# Altium footprint library Package_DFN_QFN.PcbLib: 557 footprints (part 17 of 35)
Each footprint in its own frame and in the unit in brackets; x right, y up, seen from the top. Pads: shape width x height; smd on the part's side, far side on the other; paste and mask are expansions set on the pad; w line width, h text height; cw(c..) or ccw(c..) is an arc to the next point about the centre after c.
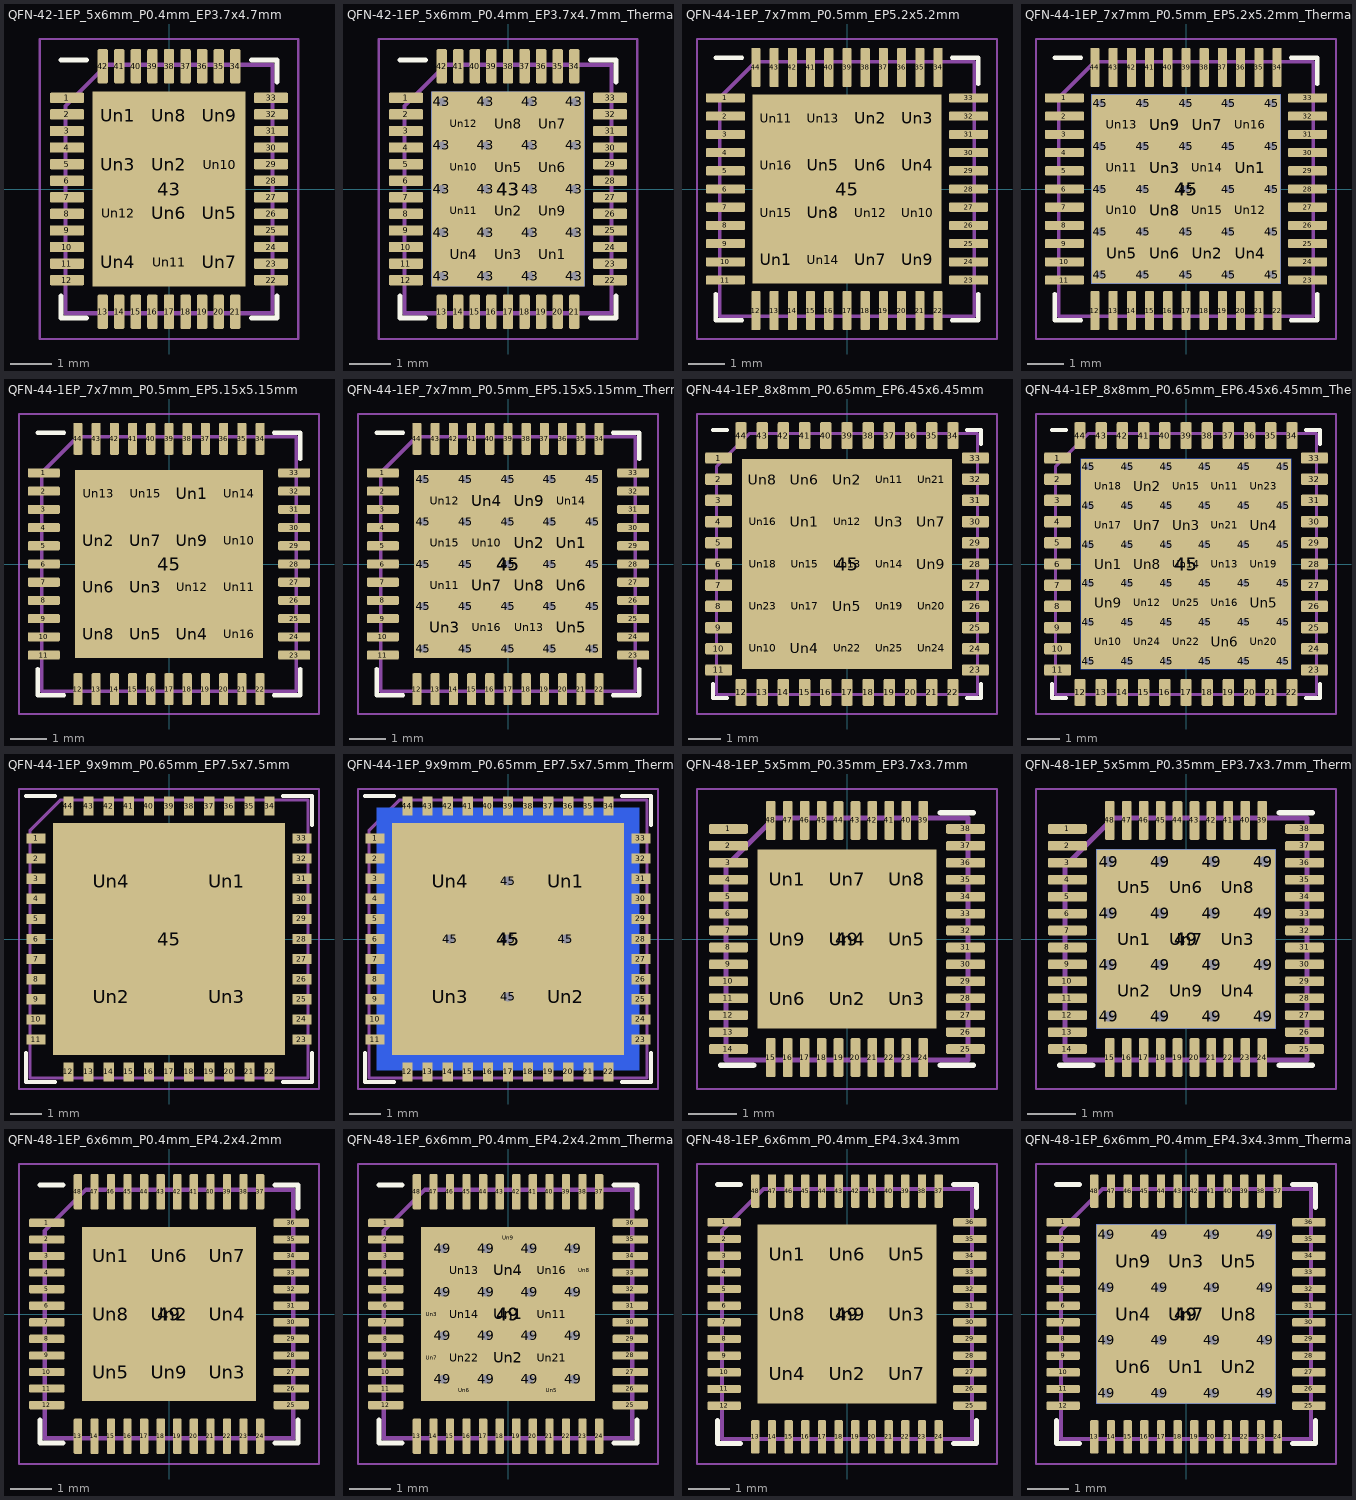
[diagram p16: the footprints below, top view; thin cyan lines are the x and y axes]

## QFN-42-1EP_5x6mm_P0.4mm_EP3.7x4.7mm [mm]
pads (55):
  rrect25% 0.825x0.25 smd: 1(-2.462,2.2) 2(-2.462,1.8) 3(-2.462,1.4) 4(-2.462,1) 5(-2.462,0.6) 6(-2.462,0.2) 7(-2.462,-0.2) 8(-2.462,-0.6) 9(-2.462,-1) 10(-2.462,-1.4) 11(-2.462,-1.8) 12(-2.462,-2.2) 22(2.462,-2.2) 23(2.462,-1.8) 24(2.462,-1.4) 25(2.462,-1) 26(2.462,-0.6) 27(2.462,-0.2) 28(2.462,0.2) 29(2.462,0.6) 30(2.462,1) 31(2.462,1.4) 32(2.462,1.8) 33(2.462,2.2)
  rrect25% 0.25x0.825 smd: 13(-1.6,-2.963) 14(-1.2,-2.963) 15(-0.8,-2.963) 16(-0.4,-2.963) 17(0,-2.963) 18(0.4,-2.963) 19(0.8,-2.963) 20(1.2,-2.963) 21(1.6,-2.963) 34(1.6,2.963) 35(1.2,2.963) 36(0.8,2.963) 37(0.4,2.963) 38(0,2.963) 39(-0.4,2.963) 40(-0.8,2.963) 41(-1.2,2.963) 42(-1.6,2.963)
  rect 3.7x4.7 smd: 43(0,0)
  rrect25% 0.99x0.95 on Top Paste: Un1(-1.23,1.77) Un2(0,0.59) Un3(-1.23,0.59) Un4(-1.23,-1.77) Un5(1.23,-0.59) Un6(0,-0.59) Un7(1.23,-1.77) Un8(0,1.77) Un9(1.23,1.77) Un10(1.23,0.59) Un11(0,-1.77) Un12(-1.23,-0.59)
F.SilkS:
  lines w0.12: -2.61,-2.585 -2.61,-3.11 -1.985,-3.11 ; -2.61,3.11 -1.985,3.11 ; 1.985,-3.11 2.61,-3.11 2.61,-2.585 ; 1.985,3.11 2.61,3.11 2.61,2.585
F.CrtYd:
  lines w0.05: -3.12,-3.62 3.12,-3.62 3.12,3.62 -3.12,3.62 -3.12,-3.62
F.Fab:
  lines w0.1: -2.5,-3 -2.5,2 -1.5,3 2.5,3 2.5,-3 -2.5,-3
  text "'.Designator'" at -4.047,-0.84 h1

## QFN-42-1EP_5x6mm_P0.4mm_EP3.7x4.7mm_ThermalVias [mm]
pads (76):
  rrect25% 0.825x0.25 smd: 1(-2.462,2.2) 2(-2.462,1.8) 3(-2.462,1.4) 4(-2.462,1) 5(-2.462,0.6) 6(-2.462,0.2) 7(-2.462,-0.2) 8(-2.462,-0.6) 9(-2.462,-1) 10(-2.462,-1.4) 11(-2.462,-1.8) 12(-2.462,-2.2) 22(2.462,-2.2) 23(2.462,-1.8) 24(2.462,-1.4) 25(2.462,-1) 26(2.462,-0.6) 27(2.462,-0.2) 28(2.462,0.2) 29(2.462,0.6) 30(2.462,1) 31(2.462,1.4) 32(2.462,1.8) 33(2.462,2.2)
  rrect25% 0.25x0.825 smd: 13(-1.6,-2.963) 14(-1.2,-2.963) 15(-0.8,-2.963) 16(-0.4,-2.963) 17(0,-2.963) 18(0.4,-2.963) 19(0.8,-2.963) 20(1.2,-2.963) 21(1.6,-2.963) 34(1.6,2.963) 35(1.2,2.963) 36(0.8,2.963) 37(0.4,2.963) 38(0,2.963) 39(-0.4,2.963) 40(-0.8,2.963) 41(-1.2,2.963) 42(-1.6,2.963)
  round 0.5 hole 0.2: 43(-1.6,-2.1) 43(-1.6,-1.05) 43(-1.6,0) 43(-1.6,1.05) 43(-1.6,2.1) 43(-0.533,-2.1) 43(-0.533,-1.05) 43(-0.533,0) 43(-0.533,1.05) 43(-0.533,2.1) 43(0.533,-2.1) 43(0.533,-1.05) 43(0.533,0) 43(0.533,1.05) 43(0.533,2.1) 43(1.6,-2.1) 43(1.6,-1.05) 43(1.6,0) 43(1.6,1.05) 43(1.6,2.1)
  rect 3.7x4.7 smd: 43(0,0)
  rect 3.7x4.7 smd far side: 43(0,0)
  round 0.799 on Top Paste: Un1(1.067,-1.575) Un2(0,-0.525) Un3(0,-1.575) Un4(-1.067,-1.575) Un5(0,0.525) Un6(1.067,0.525) Un7(1.067,1.575) Un8(0,1.575) Un9(1.067,-0.525) Un10(-1.067,0.525) Un11(-1.067,-0.525) Un12(-1.067,1.575)
F.SilkS:
  lines w0.12: -2.61,-2.585 -2.61,-3.11 -1.985,-3.11 ; -2.61,3.11 -1.985,3.11 ; 1.985,-3.11 2.61,-3.11 2.61,-2.585 ; 1.985,3.11 2.61,3.11 2.61,2.585
F.Paste:
  region: 1.433,-1.323 1.433,-1.827 1.341,-1.919 0.792,-1.919 0.7,-1.827 0.7,-1.323 0.792,-1.231 1.341,-1.231
  region: 0.366,-0.273 0.366,-0.777 0.274,-0.869 -0.274,-0.869 -0.366,-0.777 -0.366,-0.273 -0.274,-0.181 0.274,-0.181
  region: 0.366,-1.323 0.366,-1.827 0.274,-1.919 -0.274,-1.919 -0.366,-1.827 -0.366,-1.323 -0.274,-1.231 0.274,-1.231
  region: -0.7,-1.323 -0.7,-1.827 -0.792,-1.919 -1.341,-1.919 -1.433,-1.827 -1.433,-1.323 -1.341,-1.231 -0.792,-1.231
  region: 0.366,0.777 0.366,0.273 0.274,0.181 -0.274,0.181 -0.366,0.273 -0.366,0.777 -0.274,0.869 0.274,0.869
  region: 1.433,0.777 1.433,0.273 1.341,0.181 0.792,0.181 0.7,0.273 0.7,0.777 0.792,0.869 1.341,0.869
  region: 1.433,1.827 1.433,1.323 1.341,1.231 0.792,1.231 0.7,1.323 0.7,1.827 0.792,1.919 1.341,1.919
  region: 0.366,1.827 0.366,1.323 0.274,1.231 -0.274,1.231 -0.366,1.323 -0.366,1.827 -0.274,1.919 0.274,1.919
  region: 1.433,-0.273 1.433,-0.777 1.341,-0.869 0.792,-0.869 0.7,-0.777 0.7,-0.273 0.792,-0.181 1.341,-0.181
  region: -0.7,0.777 -0.7,0.273 -0.792,0.181 -1.341,0.181 -1.433,0.273 -1.433,0.777 -1.341,0.869 -0.792,0.869
  region: -0.7,-0.273 -0.7,-0.777 -0.792,-0.869 -1.341,-0.869 -1.433,-0.777 -1.433,-0.273 -1.341,-0.181 -0.792,-0.181
  region: -0.7,1.827 -0.7,1.323 -0.792,1.231 -1.341,1.231 -1.433,1.323 -1.433,1.827 -1.341,1.919 -0.792,1.919
F.CrtYd:
  lines w0.05: -3.12,-3.62 3.12,-3.62 3.12,3.62 -3.12,3.62 -3.12,-3.62
F.Fab:
  lines w0.1: -2.5,-3 -2.5,2 -1.5,3 2.5,3 2.5,-3 -2.5,-3
  text "'.Designator'" at -4.047,-0.84 h1

## QFN-44-1EP_7x7mm_P0.5mm_EP5.2x5.2mm [mm]
pads (61):
  rrect25% 1.075x0.25 smd: 1(-3.337,2.5) 2(-3.337,2) 3(-3.337,1.5) 4(-3.337,1) 5(-3.337,0.5) 6(-3.337,0) 7(-3.337,-0.5) 8(-3.337,-1) 9(-3.337,-1.5) 10(-3.337,-2) 11(-3.337,-2.5) 23(3.337,-2.5) 24(3.337,-2) 25(3.337,-1.5) 26(3.337,-1) 27(3.337,-0.5) 28(3.337,0) 29(3.337,0.5) 30(3.337,1) 31(3.337,1.5) 32(3.337,2) 33(3.337,2.5)
  rrect25% 0.25x1.075 smd: 12(-2.5,-3.337) 13(-2,-3.337) 14(-1.5,-3.337) 15(-1,-3.337) 16(-0.5,-3.337) 17(0,-3.337) 18(0.5,-3.337) 19(1,-3.337) 20(1.5,-3.337) 21(2,-3.337) 22(2.5,-3.337) 34(2.5,3.337) 35(2,3.337) 36(1.5,3.337) 37(1,3.337) 38(0.5,3.337) 39(0,3.337) 40(-0.5,3.337) 41(-1,3.337) 42(-1.5,3.337) 43(-2,3.337) 44(-2.5,3.337)
  rect 5.2x5.2 smd: 45(0,0)
  rrect24% 1.05x1.05 on Top Paste: Un1(-1.95,-1.95) Un2(0.65,1.95) Un3(1.95,1.95) Un4(1.95,0.65) Un5(-0.65,0.65) Un6(0.65,0.65) Un7(0.65,-1.95) Un8(-0.65,-0.65) Un9(1.95,-1.95) Un10(1.95,-0.65) Un11(-1.95,1.95) Un12(0.65,-0.65) Un13(-0.65,1.95) Un14(-0.65,-1.95) Un15(-1.95,-0.65) Un16(-1.95,0.65)
F.SilkS:
  lines w0.12: -3.61,-2.885 -3.61,-3.61 -2.885,-3.61 ; -3.61,3.61 -2.885,3.61 ; 2.885,-3.61 3.61,-3.61 3.61,-2.885 ; 2.885,3.61 3.61,3.61 3.61,2.885
F.CrtYd:
  lines w0.05: -4.12,-4.12 4.12,-4.12 4.12,4.12 -4.12,4.12 -4.12,-4.12
F.Fab:
  lines w0.1: -3.5,-3.5 -3.5,2.5 -2.5,3.5 3.5,3.5 3.5,-3.5 -3.5,-3.5
  text "'.Designator'" at -4.047,-0.84 h1

## QFN-44-1EP_7x7mm_P0.5mm_EP5.2x5.2mm_ThermalVias [mm]
pads (87):
  rrect25% 1.075x0.25 smd: 1(-3.337,2.5) 2(-3.337,2) 3(-3.337,1.5) 4(-3.337,1) 5(-3.337,0.5) 6(-3.337,0) 7(-3.337,-0.5) 8(-3.337,-1) 9(-3.337,-1.5) 10(-3.337,-2) 11(-3.337,-2.5) 23(3.337,-2.5) 24(3.337,-2) 25(3.337,-1.5) 26(3.337,-1) 27(3.337,-0.5) 28(3.337,0) 29(3.337,0.5) 30(3.337,1) 31(3.337,1.5) 32(3.337,2) 33(3.337,2.5)
  rrect25% 0.25x1.075 smd: 12(-2.5,-3.337) 13(-2,-3.337) 14(-1.5,-3.337) 15(-1,-3.337) 16(-0.5,-3.337) 17(0,-3.337) 18(0.5,-3.337) 19(1,-3.337) 20(1.5,-3.337) 21(2,-3.337) 22(2.5,-3.337) 34(2.5,3.337) 35(2,3.337) 36(1.5,3.337) 37(1,3.337) 38(0.5,3.337) 39(0,3.337) 40(-0.5,3.337) 41(-1,3.337) 42(-1.5,3.337) 43(-2,3.337) 44(-2.5,3.337)
  round 0.5 hole 0.2: 45(-2.35,-2.35) 45(-2.35,-1.175) 45(-2.35,0) 45(-2.35,1.175) 45(-2.35,2.35) 45(-1.175,-2.35) 45(-1.175,-1.175) 45(-1.175,0) 45(-1.175,1.175) 45(-1.175,2.35) 45(0,-2.35) 45(0,-1.175) 45(0,0) 45(0,1.175) 45(0,2.35) 45(1.175,-2.35) 45(1.175,-1.175) 45(1.175,0) 45(1.175,1.175) 45(1.175,2.35) 45(2.35,-2.35) 45(2.35,-1.175) 45(2.35,0) 45(2.35,1.175) 45(2.35,2.35)
  rect 5.2x5.2 smd: 45(0,0)
  rect 5.2x5.2 smd far side: 45(0,0)
  rrect25% 1.007x1.007 on Top Paste: Un1(1.763,0.587) Un2(0.587,-1.763) Un3(-0.587,0.587) Un4(1.763,-1.763) Un5(-1.763,-1.763) Un6(-0.587,-1.763) Un7(0.587,1.763) Un8(-0.587,-0.587) Un9(-0.587,1.763) Un10(-1.763,-0.587) Un11(-1.763,0.587) Un12(1.763,-0.587) Un13(-1.763,1.763) Un14(0.587,0.587) Un15(0.587,-0.587) Un16(1.763,1.763)
F.SilkS:
  lines w0.12: -3.61,-2.885 -3.61,-3.61 -2.885,-3.61 ; -3.61,3.61 -2.885,3.61 ; 2.885,-3.61 3.61,-3.61 3.61,-2.885 ; 2.885,3.61 3.61,3.61 3.61,2.885
F.CrtYd:
  lines w0.05: -4.12,-4.12 -4.12,4.12 4.12,4.12 4.12,-4.12 -4.12,-4.12
F.Fab:
  lines w0.1: -3.5,-3.5 -3.5,2.5 -2.5,3.5 3.5,3.5 3.5,-3.5 -3.5,-3.5
  text "'.Designator'" at -4.047,-0.84 h1

## QFN-44-1EP_7x7mm_P0.5mm_EP5.15x5.15mm [mm]
pads (61):
  rrect25% 0.875x0.25 smd: 1(-3.437,2.5) 2(-3.437,2) 3(-3.437,1.5) 4(-3.437,1) 5(-3.437,0.5) 6(-3.437,0) 7(-3.437,-0.5) 8(-3.437,-1) 9(-3.437,-1.5) 10(-3.437,-2) 11(-3.437,-2.5) 23(3.437,-2.5) 24(3.437,-2) 25(3.437,-1.5) 26(3.437,-1) 27(3.437,-0.5) 28(3.437,0) 29(3.437,0.5) 30(3.437,1) 31(3.437,1.5) 32(3.437,2) 33(3.437,2.5)
  rrect25% 0.25x0.875 smd: 12(-2.5,-3.437) 13(-2,-3.437) 14(-1.5,-3.437) 15(-1,-3.437) 16(-0.5,-3.437) 17(0,-3.437) 18(0.5,-3.437) 19(1,-3.437) 20(1.5,-3.437) 21(2,-3.437) 22(2.5,-3.437) 34(2.5,3.437) 35(2,3.437) 36(1.5,3.437) 37(1,3.437) 38(0.5,3.437) 39(0,3.437) 40(-0.5,3.437) 41(-1,3.437) 42(-1.5,3.437) 43(-2,3.437) 44(-2.5,3.437)
  rect 5.15x5.15 smd: 45(0,0)
  rrect24% 1.04x1.04 on Top Paste: Un1(0.645,1.935) Un2(-1.935,0.645) Un3(-0.645,-0.645) Un4(0.645,-1.935) Un5(-0.645,-1.935) Un6(-1.935,-0.645) Un7(-0.645,0.645) Un8(-1.935,-1.935) Un9(0.645,0.645) Un10(1.935,0.645) Un11(1.935,-0.645) Un12(0.645,-0.645) Un13(-1.935,1.935) Un14(1.935,1.935) Un15(-0.645,1.935) Un16(1.935,-1.935)
F.SilkS:
  lines w0.12: -3.61,-2.885 -3.61,-3.61 -2.885,-3.61 ; -3.61,3.61 -2.885,3.61 ; 2.885,-3.61 3.61,-3.61 3.61,-2.885 ; 2.885,3.61 3.61,3.61 3.61,2.885
F.CrtYd:
  lines w0.05: -4.12,-4.12 -4.12,4.12 4.12,4.12 4.12,-4.12 -4.12,-4.12
F.Fab:
  lines w0.1: -3.5,-3.5 3.5,-3.5 3.5,3.5 -2.5,3.5 -3.5,2.5 -3.5,-3.5
  text "'.Designator'" at -4.047,-0.84 h1

## QFN-44-1EP_7x7mm_P0.5mm_EP5.15x5.15mm_ThermalVias [mm]
pads (87):
  rrect25% 0.875x0.25 smd: 1(-3.437,2.5) 2(-3.437,2) 3(-3.437,1.5) 4(-3.437,1) 5(-3.437,0.5) 6(-3.437,0) 7(-3.437,-0.5) 8(-3.437,-1) 9(-3.437,-1.5) 10(-3.437,-2) 11(-3.437,-2.5) 23(3.437,-2.5) 24(3.437,-2) 25(3.437,-1.5) 26(3.437,-1) 27(3.437,-0.5) 28(3.437,0) 29(3.437,0.5) 30(3.437,1) 31(3.437,1.5) 32(3.437,2) 33(3.437,2.5)
  rrect25% 0.25x0.875 smd: 12(-2.5,-3.437) 13(-2,-3.437) 14(-1.5,-3.437) 15(-1,-3.437) 16(-0.5,-3.437) 17(0,-3.437) 18(0.5,-3.437) 19(1,-3.437) 20(1.5,-3.437) 21(2,-3.437) 22(2.5,-3.437) 34(2.5,3.437) 35(2,3.437) 36(1.5,3.437) 37(1,3.437) 38(0.5,3.437) 39(0,3.437) 40(-0.5,3.437) 41(-1,3.437) 42(-1.5,3.437) 43(-2,3.437) 44(-2.5,3.437)
  round 0.5 hole 0.2: 45(-2.325,-2.325) 45(-2.325,-1.162) 45(-2.325,0) 45(-2.325,1.162) 45(-2.325,2.325) 45(-1.162,-2.325) 45(-1.162,-1.162) 45(-1.162,0) 45(-1.162,1.162) 45(-1.162,2.325) 45(0,-2.325) 45(0,-1.162) 45(0,0) 45(0,1.162) 45(0,2.325) 45(1.162,-2.325) 45(1.162,-1.162) 45(1.162,0) 45(1.162,1.162) 45(1.162,2.325) 45(2.325,-2.325) 45(2.325,-1.162) 45(2.325,0) 45(2.325,1.162) 45(2.325,2.325)
  rect 5.15x5.15 smd: 45(0,0)
  rect 5.15x5.15 smd far side: 45(0,0)
  rrect25% 0.997x0.997 on Top Paste: Un1(1.744,0.581) Un2(0.581,0.581) Un3(-1.744,-1.744) Un4(-0.581,1.744) Un5(1.744,-1.744) Un6(1.744,-0.581) Un7(-0.581,-0.581) Un8(0.581,-0.581) Un9(0.581,1.744) Un10(-0.581,0.581) Un11(-1.744,-0.581) Un12(-1.744,1.744) Un13(0.581,-1.744) Un14(1.744,1.744) Un15(-1.744,0.581) Un16(-0.581,-1.744)
F.SilkS:
  lines w0.12: -3.61,-2.885 -3.61,-3.61 -2.885,-3.61 ; -3.61,3.61 -2.885,3.61 ; 2.885,-3.61 3.61,-3.61 3.61,-2.885 ; 2.885,3.61 3.61,3.61 3.61,2.885
F.CrtYd:
  lines w0.05: -4.12,-4.12 -4.12,4.12 4.12,4.12 4.12,-4.12 -4.12,-4.12
F.Fab:
  lines w0.1: -3.5,-3.5 -3.5,2.5 -2.5,3.5 3.5,3.5 3.5,-3.5 -3.5,-3.5
  text "'.Designator'" at -4.047,-0.84 h1

## QFN-44-1EP_8x8mm_P0.65mm_EP6.45x6.45mm [mm]
pads (70):
  rrect25% 0.825x0.35 smd: 1(-3.938,3.25) 2(-3.938,2.6) 3(-3.938,1.95) 4(-3.938,1.3) 5(-3.938,0.65) 6(-3.938,0) 7(-3.938,-0.65) 8(-3.938,-1.3) 9(-3.938,-1.95) 10(-3.938,-2.6) 11(-3.938,-3.25) 23(3.938,-3.25) 24(3.938,-2.6) 25(3.938,-1.95) 26(3.938,-1.3) 27(3.938,-0.65) 28(3.938,0) 29(3.938,0.65) 30(3.938,1.3) 31(3.938,1.95) 32(3.938,2.6) 33(3.938,3.25)
  rrect25% 0.35x0.825 smd: 12(-3.25,-3.938) 13(-2.6,-3.938) 14(-1.95,-3.938) 15(-1.3,-3.938) 16(-0.65,-3.938) 17(0,-3.938) 18(0.65,-3.938) 19(1.3,-3.938) 20(1.95,-3.938) 21(2.6,-3.938) 22(3.25,-3.938) 34(3.25,3.938) 35(2.6,3.938) 36(1.95,3.938) 37(1.3,3.938) 38(0.65,3.938) 39(0,3.938) 40(-0.65,3.938) 41(-1.3,3.938) 42(-1.95,3.938) 43(-2.6,3.938) 44(-3.25,3.938)
  rect 6.45x6.45 smd: 45(0,0)
  rrect24% 1.04x1.04 on Top Paste: Un1(-1.29,1.29) Un2(0,2.58) Un3(1.29,1.29) Un4(-1.29,-2.58) Un5(0,-1.29) Un6(-1.29,2.58) Un7(2.58,1.29) Un8(-2.58,2.58) Un9(2.58,0) Un10(-2.58,-2.58) Un11(1.29,2.58) Un12(0,1.29) Un13(0,0) Un14(1.29,0) Un15(-1.29,0) Un16(-2.58,1.29) Un17(-1.29,-1.29) Un18(-2.58,0) Un19(1.29,-1.29) Un20(2.58,-1.29) Un21(2.58,2.58) Un22(0,-2.58) Un23(-2.58,-1.29) Un24(2.58,-2.58) Un25(1.29,-2.58)
F.SilkS:
  lines w0.12: -4.11,-3.685 -4.11,-4.11 -3.685,-4.11 ; -4.11,4.11 -3.685,4.11 ; 3.685,-4.11 4.11,-4.11 4.11,-3.685 ; 3.685,4.11 4.11,4.11 4.11,3.685
F.CrtYd:
  lines w0.05: -4.6,-4.6 4.6,-4.6 4.6,4.6 -4.6,4.6 -4.6,-4.6
F.Fab:
  lines w0.1: -4,-4 4,-4 4,4 -3,4 -4,3 -4,-4
  text "'.Designator'" at -4.047,-0.84 h1

## QFN-44-1EP_8x8mm_P0.65mm_EP6.45x6.45mm_ThermalVias [mm]
pads (107):
  rrect25% 0.825x0.35 smd: 1(-3.938,3.25) 2(-3.938,2.6) 3(-3.938,1.95) 4(-3.938,1.3) 5(-3.938,0.65) 6(-3.938,0) 7(-3.938,-0.65) 8(-3.938,-1.3) 9(-3.938,-1.95) 10(-3.938,-2.6) 11(-3.938,-3.25) 23(3.938,-3.25) 24(3.938,-2.6) 25(3.938,-1.95) 26(3.938,-1.3) 27(3.938,-0.65) 28(3.938,0) 29(3.938,0.65) 30(3.938,1.3) 31(3.938,1.95) 32(3.938,2.6) 33(3.938,3.25)
  rrect25% 0.35x0.825 smd: 12(-3.25,-3.938) 13(-2.6,-3.938) 14(-1.95,-3.938) 15(-1.3,-3.938) 16(-0.65,-3.938) 17(0,-3.938) 18(0.65,-3.938) 19(1.3,-3.938) 20(1.95,-3.938) 21(2.6,-3.938) 22(3.25,-3.938) 34(3.25,3.938) 35(2.6,3.938) 36(1.95,3.938) 37(1.3,3.938) 38(0.65,3.938) 39(0,3.938) 40(-0.65,3.938) 41(-1.3,3.938) 42(-1.95,3.938) 43(-2.6,3.938) 44(-3.25,3.938)
  round 0.5 hole 0.2: 45(-2.975,-2.975) 45(-2.975,-1.785) 45(-2.975,-0.595) 45(-2.975,0.595) 45(-2.975,1.785) 45(-2.975,2.975) 45(-1.785,-2.975) 45(-1.785,-1.785) 45(-1.785,-0.595) 45(-1.785,0.595) 45(-1.785,1.785) 45(-1.785,2.975) 45(-0.595,-2.975) 45(-0.595,-1.785) 45(-0.595,-0.595) 45(-0.595,0.595) 45(-0.595,1.785) 45(-0.595,2.975) 45(0.595,-2.975) 45(0.595,-1.785) 45(0.595,-0.595) 45(0.595,0.595) 45(0.595,1.785) 45(0.595,2.975) 45(1.785,-2.975) 45(1.785,-1.785) 45(1.785,-0.595) 45(1.785,0.595) 45(1.785,1.785) 45(1.785,2.975) 45(2.975,-2.975) 45(2.975,-1.785) 45(2.975,-0.595) 45(2.975,0.595) 45(2.975,1.785) 45(2.975,2.975)
  rect 6.45x6.45 smd: 45(0,0)
  rect 6.45x6.45 smd far side: 45(0,0)
  rrect25% 0.999x0.999 on Top Paste: Un1(-2.38,0) Un2(-1.19,2.38) Un3(0,1.19) Un4(2.38,1.19) Un5(2.38,-1.19) Un6(1.19,-2.38) Un7(-1.19,1.19) Un8(-1.19,0) Un9(-2.38,-1.19) Un10(-2.38,-2.38) Un11(1.19,2.38) Un12(-1.19,-1.19) Un13(1.19,0) Un14(0,0) Un15(0,2.38) Un16(1.19,-1.19) Un17(-2.38,1.19) Un18(-2.38,2.38) Un19(2.38,0) Un20(2.38,-2.38) Un21(1.19,1.19) Un22(0,-2.38) Un23(2.38,2.38) Un24(-1.19,-2.38) Un25(0,-1.19)
F.SilkS:
  lines w0.12: -4.11,-3.685 -4.11,-4.11 -3.685,-4.11 ; -4.11,4.11 -3.685,4.11 ; 3.685,-4.11 4.11,-4.11 4.11,-3.685 ; 3.685,4.11 4.11,4.11 4.11,3.685
F.CrtYd:
  lines w0.05: -4.6,-4.6 -4.6,4.6 4.6,4.6 4.6,-4.6 -4.6,-4.6
F.Fab:
  lines w0.1: -4,-4 4,-4 4,4 -3,4 -4,3 -4,-4
  text "'.Designator'" at -4.047,-0.84 h1

## QFN-44-1EP_9x9mm_P0.65mm_EP7.5x7.5mm [mm]
pads (49):
  rect 0.6x0.33 smd: 1(-4.3,3.25) 2(-4.3,2.6) 3(-4.3,1.95) 4(-4.3,1.3) 5(-4.3,0.65) 6(-4.3,0) 7(-4.3,-0.65) 8(-4.3,-1.3) 9(-4.3,-1.95) 10(-4.3,-2.6) 11(-4.3,-3.25) 23(4.3,-3.25) 24(4.3,-2.6) 25(4.3,-1.95) 26(4.3,-1.3) 27(4.3,-0.65) 28(4.3,0) 29(4.3,0.65) 30(4.3,1.3) 31(4.3,1.95) 32(4.3,2.6) 33(4.3,3.25)
  rect 0.33x0.6 smd: 12(-3.25,-4.3) 13(-2.6,-4.3) 14(-1.95,-4.3) 15(-1.3,-4.3) 16(-0.65,-4.3) 17(0,-4.3) 18(0.65,-4.3) 19(1.3,-4.3) 20(1.95,-4.3) 21(2.6,-4.3) 22(3.25,-4.3) 34(3.25,4.3) 35(2.6,4.3) 36(1.95,4.3) 37(1.3,4.3) 38(0.65,4.3) 39(0,4.3) 40(-0.65,4.3) 41(-1.3,4.3) 42(-1.95,4.3) 43(-2.6,4.3) 44(-3.25,4.3)
  rect 7.5x7.5 smd: 45(0,0)
  rect 2.65x2.65 on Top Paste: Un1(1.875,1.875) Un2(-1.875,-1.875) Un3(1.875,-1.875) Un4(-1.875,1.875)
F.SilkS:
  lines w0.12: -4.625,-3.675 -4.625,-4.625 -3.675,-4.625 ; -4.625,4.625 -3.675,4.625 ; 3.675,-4.625 4.625,-4.625 4.625,-3.675 ; 3.675,4.625 4.625,4.625 4.625,3.675
F.CrtYd:
  lines w0.05: -4.85,-4.85 4.85,-4.85 4.85,4.85 -4.85,4.85 -4.85,-4.85
F.Fab:
  lines w0.1: -4.5,-4.5 -4.5,3.5 -3.5,4.5 4.5,4.5 4.5,-4.5 -4.5,-4.5
  text "'.Designator'" at -2.658,-0.574 h0.65

## QFN-44-1EP_9x9mm_P0.65mm_EP7.5x7.5mm_ThermalVias [mm]
pads (55):
  rect 0.6x0.33 smd: 1(-4.3,3.25) 2(-4.3,2.6) 3(-4.3,1.95) 4(-4.3,1.3) 5(-4.3,0.65) 6(-4.3,0) 7(-4.3,-0.65) 8(-4.3,-1.3) 9(-4.3,-1.95) 10(-4.3,-2.6) 11(-4.3,-3.25) 23(4.3,-3.25) 24(4.3,-2.6) 25(4.3,-1.95) 26(4.3,-1.3) 27(4.3,-0.65) 28(4.3,0) 29(4.3,0.65) 30(4.3,1.3) 31(4.3,1.95) 32(4.3,2.6) 33(4.3,3.25)
  rect 0.33x0.6 smd: 12(-3.25,-4.3) 13(-2.6,-4.3) 14(-1.95,-4.3) 15(-1.3,-4.3) 16(-0.65,-4.3) 17(0,-4.3) 18(0.65,-4.3) 19(1.3,-4.3) 20(1.95,-4.3) 21(2.6,-4.3) 22(3.25,-4.3) 34(3.25,4.3) 35(2.6,4.3) 36(1.95,4.3) 37(1.3,4.3) 38(0.65,4.3) 39(0,4.3) 40(-0.65,4.3) 41(-1.3,4.3) 42(-1.95,4.3) 43(-2.6,4.3) 44(-3.25,4.3)
  round 0.6 hole 0.3: 45(-1.875,0) 45(0,-1.875) 45(0,0) 45(0,1.875) 45(1.875,0)
  rect 7.5x7.5 smd: 45(0,0)
  rect 8.5x8.5 smd far side: 45(0,0)
  rect 2.65x2.65 on Top Paste: Un1(1.875,1.875) Un2(1.875,-1.875) Un3(-1.875,-1.875) Un4(-1.875,1.875)
F.SilkS:
  lines w0.12: -4.625,-3.675 -4.625,-4.625 -3.675,-4.625 ; -4.625,4.625 -3.675,4.625 ; 3.675,-4.625 4.625,-4.625 4.625,-3.675 ; 3.675,4.625 4.625,4.625 4.625,3.675
F.CrtYd:
  lines w0.05: -4.85,-4.85 4.85,-4.85 4.85,4.85 -4.85,4.85 -4.85,-4.85
F.Fab:
  lines w0.1: -4.5,-4.5 -4.5,3.5 -3.5,4.5 4.5,4.5 4.5,-4.5 -4.5,-4.5
  text "'.Designator'" at -2.658,-0.574 h0.65

## QFN-48-1EP_5x5mm_P0.35mm_EP3.7x3.7mm [mm]
pads (58):
  rrect25% 0.8x0.2 smd: 1(-2.45,2.275) 2(-2.45,1.925) 3(-2.45,1.575) 4(-2.45,1.225) 5(-2.45,0.875) 6(-2.45,0.525) 7(-2.45,0.175) 8(-2.45,-0.175) 9(-2.45,-0.525) 10(-2.45,-0.875) 11(-2.45,-1.225) 12(-2.45,-1.575) 13(-2.45,-1.925) 14(-2.45,-2.275) 25(2.45,-2.275) 26(2.45,-1.925) 27(2.45,-1.575) 28(2.45,-1.225) 29(2.45,-0.875) 30(2.45,-0.525) 31(2.45,-0.175) 32(2.45,0.175) 33(2.45,0.525) 34(2.45,0.875) 35(2.45,1.225) 36(2.45,1.575) 37(2.45,1.925) 38(2.45,2.275)
  rrect25% 0.2x0.8 smd: 15(-1.575,-2.45) 16(-1.225,-2.45) 17(-0.875,-2.45) 18(-0.525,-2.45) 19(-0.175,-2.45) 20(0.175,-2.45) 21(0.525,-2.45) 22(0.875,-2.45) 23(1.225,-2.45) 24(1.575,-2.45) 39(1.575,2.45) 40(1.225,2.45) 41(0.875,2.45) 42(0.525,2.45) 43(0.175,2.45) 44(-0.175,2.45) 45(-0.525,2.45) 46(-0.875,2.45) 47(-1.225,2.45) 48(-1.575,2.45)
  rect 3.7x3.7 smd: 49(0,0)
  rrect25% 0.99x0.99 on Top Paste: Un1(-1.23,1.23) Un2(0,-1.23) Un3(1.23,-1.23) Un4(0,0) Un5(1.23,0) Un6(-1.23,-1.23) Un7(0,1.23) Un8(1.23,1.23) Un9(-1.23,0)
F.SilkS:
  lines w0.12: -2.61,-2.61 -1.935,-2.61 ; 1.935,-2.61 2.61,-2.61 ; 1.935,2.61 2.61,2.61
F.CrtYd:
  lines w0.05: -3.1,-3.1 3.1,-3.1 3.1,3.1 -3.1,3.1 -3.1,-3.1
F.Fab:
  lines w0.1: -2.5,-2.5 -2.5,1.5 -1.5,2.5 2.5,2.5 2.5,-2.5 -2.5,-2.5
  text "'.Designator'" at -4.047,-0.84 h1

## QFN-48-1EP_5x5mm_P0.35mm_EP3.7x3.7mm_ThermalVias [mm]
pads (75):
  rrect25% 0.8x0.2 smd: 1(-2.45,2.275) 2(-2.45,1.925) 3(-2.45,1.575) 4(-2.45,1.225) 5(-2.45,0.875) 6(-2.45,0.525) 7(-2.45,0.175) 8(-2.45,-0.175) 9(-2.45,-0.525) 10(-2.45,-0.875) 11(-2.45,-1.225) 12(-2.45,-1.575) 13(-2.45,-1.925) 14(-2.45,-2.275) 25(2.45,-2.275) 26(2.45,-1.925) 27(2.45,-1.575) 28(2.45,-1.225) 29(2.45,-0.875) 30(2.45,-0.525) 31(2.45,-0.175) 32(2.45,0.175) 33(2.45,0.525) 34(2.45,0.875) 35(2.45,1.225) 36(2.45,1.575) 37(2.45,1.925) 38(2.45,2.275)
  rrect25% 0.2x0.8 smd: 15(-1.575,-2.45) 16(-1.225,-2.45) 17(-0.875,-2.45) 18(-0.525,-2.45) 19(-0.175,-2.45) 20(0.175,-2.45) 21(0.525,-2.45) 22(0.875,-2.45) 23(1.225,-2.45) 24(1.575,-2.45) 39(1.575,2.45) 40(1.225,2.45) 41(0.875,2.45) 42(0.525,2.45) 43(0.175,2.45) 44(-0.175,2.45) 45(-0.525,2.45) 46(-0.875,2.45) 47(-1.225,2.45) 48(-1.575,2.45)
  round 0.5 hole 0.2: 49(-1.6,-1.6) 49(-1.6,-0.533) 49(-1.6,0.533) 49(-1.6,1.6) 49(-0.533,-1.6) 49(-0.533,-0.533) 49(-0.533,0.533) 49(-0.533,1.6) 49(0.533,-1.6) 49(0.533,-0.533) 49(0.533,0.533) 49(0.533,1.6) 49(1.6,-1.6) 49(1.6,-0.533) 49(1.6,0.533) 49(1.6,1.6)
  rect 3.7x3.7 smd: 49(0,0)
  rect 3.7x3.7 smd far side: 49(0,0)
  round 0.834 on Top Paste: Un1(-1.067,0) Un2(-1.067,-1.067) Un3(1.067,0) Un4(1.067,-1.067) Un5(-1.067,1.067) Un6(0,1.067) Un7(0,0) Un8(1.067,1.067) Un9(0,-1.067)
F.SilkS:
  lines w0.12: -2.61,-2.61 -1.935,-2.61 ; 1.935,-2.61 2.61,-2.61 ; 1.935,2.61 2.61,2.61
F.Paste:
  region: -0.71,0.256 -0.71,-0.256 -0.811,-0.356 -1.323,-0.356 -1.423,-0.256 -1.423,0.256 -1.323,0.356 -0.811,0.356
  region: -0.71,-0.811 -0.71,-1.323 -0.811,-1.423 -1.323,-1.423 -1.423,-1.323 -1.423,-0.811 -1.323,-0.71 -0.811,-0.71
  region: 1.423,0.256 1.423,-0.256 1.323,-0.356 0.811,-0.356 0.71,-0.256 0.71,0.256 0.811,0.356 1.323,0.356
  region: 1.423,-0.811 1.423,-1.323 1.323,-1.423 0.811,-1.423 0.71,-1.323 0.71,-0.811 0.811,-0.71 1.323,-0.71
  region: -0.71,1.323 -0.71,0.811 -0.811,0.71 -1.323,0.71 -1.423,0.811 -1.423,1.323 -1.323,1.423 -0.811,1.423
  region: 0.356,1.323 0.356,0.811 0.256,0.71 -0.256,0.71 -0.356,0.811 -0.356,1.323 -0.256,1.423 0.256,1.423
  region: 0.356,0.256 0.356,-0.256 0.256,-0.356 -0.256,-0.356 -0.356,-0.256 -0.356,0.256 -0.256,0.356 0.256,0.356
  region: 1.423,1.323 1.423,0.811 1.323,0.71 0.811,0.71 0.71,0.811 0.71,1.323 0.811,1.423 1.323,1.423
  region: 0.356,-0.811 0.356,-1.323 0.256,-1.423 -0.256,-1.423 -0.356,-1.323 -0.356,-0.811 -0.256,-0.71 0.256,-0.71
F.CrtYd:
  lines w0.05: -3.1,-3.1 3.1,-3.1 3.1,3.1 -3.1,3.1 -3.1,-3.1
F.Fab:
  lines w0.1: -2.5,-2.5 2.5,-2.5 2.5,2.5 -1.5,2.5 -2.5,1.5 -2.5,-2.5
  text "'.Designator'" at -4.047,-0.84 h1

## QFN-48-1EP_6x6mm_P0.4mm_EP4.2x4.2mm [mm]
pads (58):
  rrect25% 0.85x0.2 smd: 1(-2.95,2.2) 2(-2.95,1.8) 3(-2.95,1.4) 4(-2.95,1) 5(-2.95,0.6) 6(-2.95,0.2) 7(-2.95,-0.2) 8(-2.95,-0.6) 9(-2.95,-1) 10(-2.95,-1.4) 11(-2.95,-1.8) 12(-2.95,-2.2) 25(2.95,-2.2) 26(2.95,-1.8) 27(2.95,-1.4) 28(2.95,-1) 29(2.95,-0.6) 30(2.95,-0.2) 31(2.95,0.2) 32(2.95,0.6) 33(2.95,1) 34(2.95,1.4) 35(2.95,1.8) 36(2.95,2.2)
  rrect25% 0.2x0.85 smd: 13(-2.2,-2.95) 14(-1.8,-2.95) 15(-1.4,-2.95) 16(-1,-2.95) 17(-0.6,-2.95) 18(-0.2,-2.95) 19(0.2,-2.95) 20(0.6,-2.95) 21(1,-2.95) 22(1.4,-2.95) 23(1.8,-2.95) 24(2.2,-2.95) 37(2.2,2.95) 38(1.8,2.95) 39(1.4,2.95) 40(1,2.95) 41(0.6,2.95) 42(0.2,2.95) 43(-0.2,2.95) 44(-0.6,2.95) 45(-1,2.95) 46(-1.4,2.95) 47(-1.8,2.95) 48(-2.2,2.95)
  rect 4.2x4.2 smd: 49(0,0)
  rrect22% 1.13x1.13 on Top Paste: Un1(-1.4,1.4) Un2(0,0) Un3(1.4,-1.4) Un4(1.4,0) Un5(-1.4,-1.4) Un6(0,1.4) Un7(1.4,1.4) Un8(-1.4,0) Un9(0,-1.4)
F.SilkS:
  lines w0.12: -3.11,-2.56 -3.11,-3.11 -2.56,-3.11 ; -3.11,3.11 -2.56,3.11 ; 2.56,-3.11 3.11,-3.11 3.11,-2.56 ; 2.56,3.11 3.11,3.11 3.11,2.56
F.CrtYd:
  lines w0.05: -3.62,-3.62 -3.62,3.62 3.62,3.62 3.62,-3.62 -3.62,-3.62
F.Fab:
  lines w0.1: -3,-3 3,-3 3,3 -2,3 -3,2 -3,-3
  text "'.Designator'" at -4.047,-0.84 h1

## QFN-48-1EP_6x6mm_P0.4mm_EP4.2x4.2mm_ThermalVias [mm]
pads (91):
  rrect25% 0.85x0.2 smd: 1(-2.95,2.2) 2(-2.95,1.8) 3(-2.95,1.4) 4(-2.95,1) 5(-2.95,0.6) 6(-2.95,0.2) 7(-2.95,-0.2) 8(-2.95,-0.6) 9(-2.95,-1) 10(-2.95,-1.4) 11(-2.95,-1.8) 12(-2.95,-2.2) 25(2.95,-2.2) 26(2.95,-1.8) 27(2.95,-1.4) 28(2.95,-1) 29(2.95,-0.6) 30(2.95,-0.2) 31(2.95,0.2) 32(2.95,0.6) 33(2.95,1) 34(2.95,1.4) 35(2.95,1.8) 36(2.95,2.2)
  rrect25% 0.2x0.85 smd: 13(-2.2,-2.95) 14(-1.8,-2.95) 15(-1.4,-2.95) 16(-1,-2.95) 17(-0.6,-2.95) 18(-0.2,-2.95) 19(0.2,-2.95) 20(0.6,-2.95) 21(1,-2.95) 22(1.4,-2.95) 23(1.8,-2.95) 24(2.2,-2.95) 37(2.2,2.95) 38(1.8,2.95) 39(1.4,2.95) 40(1,2.95) 41(0.6,2.95) 42(0.2,2.95) 43(-0.2,2.95) 44(-0.6,2.95) 45(-1,2.95) 46(-1.4,2.95) 47(-1.8,2.95) 48(-2.2,2.95)
  round 0.5 hole 0.2: 49(-1.575,-1.575) 49(-1.575,-0.525) 49(-1.575,0.525) 49(-1.575,1.575) 49(-0.525,-1.575) 49(-0.525,-0.525) 49(-0.525,0.525) 49(-0.525,1.575) 49(0.525,-1.575) 49(0.525,-0.525) 49(0.525,0.525) 49(0.525,1.575) 49(1.575,-1.575) 49(1.575,-0.525) 49(1.575,0.525) 49(1.575,1.575)
  rect 3.65x3.65 smd far side: 49(0,0)
  rect 4.2x4.2 smd: 49(0,0)
  rrect25% 0.847x0.847 on Top Paste: Un1(0,0) Un2(0,-1.05) Un4(0,1.05) Un11(1.05,0) Un13(-1.05,1.05) Un14(-1.05,0) Un16(1.05,1.05) Un21(1.05,-1.05) Un22(-1.05,-1.05)
  round 0.331 on Top Paste: Un3(-1.837,0) Un5(1.05,-1.837) Un6(-1.05,-1.837) Un7(-1.837,-1.05) Un8(1.837,1.05) Un9(0,1.837) Un10(1.837,-1.05) Un12(1.05,1.837) Un17(-1.837,1.05) Un18(1.837,0) Un20(0,-1.837) Un23(-1.05,1.837)
  round 0.295 on Top Paste: Un15(1.837,1.837) Un19(-1.837,-1.837) Un24(-1.837,1.837) Un25(1.837,-1.837)
F.SilkS:
  lines w0.12: -3.11,-2.56 -3.11,-3.11 -2.56,-3.11 ; -3.11,3.11 -2.56,3.11 ; 2.56,-3.11 3.11,-3.11 3.11,-2.56 ; 2.56,3.11 3.11,3.11 3.11,2.56
F.Paste:
  region: -1.718,0.255 -1.718,-0.255 -1.794,-0.331 -1.957,-0.331 -1.957,0.331 -1.794,0.331
  region: 1.381,-1.794 1.381,-1.957 0.719,-1.957 0.719,-1.794 0.795,-1.718 1.305,-1.718
  region: -0.719,-1.794 -0.719,-1.957 -1.381,-1.957 -1.381,-1.794 -1.305,-1.718 -0.795,-1.718
  region: -1.718,-0.795 -1.718,-1.305 -1.794,-1.381 -1.957,-1.381 -1.957,-0.719 -1.794,-0.719
  region: 1.957,0.719 1.794,0.719 1.718,0.795 1.718,1.305 1.794,1.381 1.957,1.381
  region: 0.331,1.794 0.255,1.718 -0.255,1.718 -0.331,1.794 -0.331,1.957 0.331,1.957
  region: 1.957,-1.381 1.794,-1.381 1.718,-1.305 1.718,-0.795 1.794,-0.719 1.957,-0.719
  region: 1.381,1.794 1.305,1.718 0.795,1.718 0.719,1.794 0.719,1.957 1.381,1.957
  region: 1.943,1.732 1.851,1.732 1.732,1.851 1.732,1.943 1.943,1.943
  region: -1.718,1.305 -1.718,0.795 -1.794,0.719 -1.957,0.719 -1.957,1.381 -1.794,1.381
  region: 1.957,-0.331 1.794,-0.331 1.718,-0.255 1.718,0.255 1.794,0.331 1.957,0.331
  region: -1.732,-1.851 -1.732,-1.943 -1.943,-1.943 -1.943,-1.732 -1.851,-1.732
  region: 0.331,-1.794 0.331,-1.957 -0.331,-1.957 -0.331,-1.794 -0.255,-1.718 0.255,-1.718
  region: -0.719,1.794 -0.795,1.718 -1.305,1.718 -1.381,1.794 -1.381,1.957 -0.719,1.957
  region: -1.732,1.851 -1.851,1.732 -1.943,1.732 -1.943,1.943 -1.732,1.943
  region: 1.943,-1.943 1.732,-1.943 1.732,-1.851 1.851,-1.732 1.943,-1.732
F.CrtYd:
  lines w0.05: -3.62,-3.62 -3.62,3.62 3.62,3.62 3.62,-3.62 -3.62,-3.62
F.Fab:
  lines w0.1: -3,-3 3,-3 3,3 -2,3 -3,2 -3,-3
  text "'.Designator'" at -4.047,-0.84 h1

## QFN-48-1EP_6x6mm_P0.4mm_EP4.3x4.3mm [mm]
pads (58):
  rrect25% 0.8x0.2 smd: 1(-2.95,2.2) 2(-2.95,1.8) 3(-2.95,1.4) 4(-2.95,1) 5(-2.95,0.6) 6(-2.95,0.2) 7(-2.95,-0.2) 8(-2.95,-0.6) 9(-2.95,-1) 10(-2.95,-1.4) 11(-2.95,-1.8) 12(-2.95,-2.2) 25(2.95,-2.2) 26(2.95,-1.8) 27(2.95,-1.4) 28(2.95,-1) 29(2.95,-0.6) 30(2.95,-0.2) 31(2.95,0.2) 32(2.95,0.6) 33(2.95,1) 34(2.95,1.4) 35(2.95,1.8) 36(2.95,2.2)
  rrect25% 0.2x0.8 smd: 13(-2.2,-2.95) 14(-1.8,-2.95) 15(-1.4,-2.95) 16(-1,-2.95) 17(-0.6,-2.95) 18(-0.2,-2.95) 19(0.2,-2.95) 20(0.6,-2.95) 21(1,-2.95) 22(1.4,-2.95) 23(1.8,-2.95) 24(2.2,-2.95) 37(2.2,2.95) 38(1.8,2.95) 39(1.4,2.95) 40(1,2.95) 41(0.6,2.95) 42(0.2,2.95) 43(-0.2,2.95) 44(-0.6,2.95) 45(-1,2.95) 46(-1.4,2.95) 47(-1.8,2.95) 48(-2.2,2.95)
  rect 4.3x4.3 smd: 49(0,0)
  rrect22% 1.16x1.16 on Top Paste: Un1(-1.43,1.43) Un2(0,-1.43) Un3(1.43,0) Un4(-1.43,-1.43) Un5(1.43,1.43) Un6(0,1.43) Un7(1.43,-1.43) Un8(-1.43,0) Un9(0,0)
F.SilkS:
  lines w0.12: -3.11,-2.56 -3.11,-3.11 -2.56,-3.11 ; -3.11,3.11 -2.56,3.11 ; 2.56,-3.11 3.11,-3.11 3.11,-2.56 ; 2.56,3.11 3.11,3.11 3.11,2.56
F.CrtYd:
  lines w0.05: -3.6,-3.6 3.6,-3.6 3.6,3.6 -3.6,3.6 -3.6,-3.6
F.Fab:
  lines w0.1: -3,-3 -3,2 -2,3 3,3 3,-3 -3,-3
  text "'.Designator'" at -4.047,-0.84 h1

## QFN-48-1EP_6x6mm_P0.4mm_EP4.3x4.3mm_ThermalVias [mm]
pads (75):
  rrect25% 0.8x0.2 smd: 1(-2.95,2.2) 2(-2.95,1.8) 3(-2.95,1.4) 4(-2.95,1) 5(-2.95,0.6) 6(-2.95,0.2) 7(-2.95,-0.2) 8(-2.95,-0.6) 9(-2.95,-1) 10(-2.95,-1.4) 11(-2.95,-1.8) 12(-2.95,-2.2) 25(2.95,-2.2) 26(2.95,-1.8) 27(2.95,-1.4) 28(2.95,-1) 29(2.95,-0.6) 30(2.95,-0.2) 31(2.95,0.2) 32(2.95,0.6) 33(2.95,1) 34(2.95,1.4) 35(2.95,1.8) 36(2.95,2.2)
  rrect25% 0.2x0.8 smd: 13(-2.2,-2.95) 14(-1.8,-2.95) 15(-1.4,-2.95) 16(-1,-2.95) 17(-0.6,-2.95) 18(-0.2,-2.95) 19(0.2,-2.95) 20(0.6,-2.95) 21(1,-2.95) 22(1.4,-2.95) 23(1.8,-2.95) 24(2.2,-2.95) 37(2.2,2.95) 38(1.8,2.95) 39(1.4,2.95) 40(1,2.95) 41(0.6,2.95) 42(0.2,2.95) 43(-0.2,2.95) 44(-0.6,2.95) 45(-1,2.95) 46(-1.4,2.95) 47(-1.8,2.95) 48(-2.2,2.95)
  round 0.5 hole 0.2: 49(-1.9,-1.9) 49(-1.9,-0.633) 49(-1.9,0.633) 49(-1.9,1.9) 49(-0.633,-1.9) 49(-0.633,-0.633) 49(-0.633,0.633) 49(-0.633,1.9) 49(0.633,-1.9) 49(0.633,-0.633) 49(0.633,0.633) 49(0.633,1.9) 49(1.9,-1.9) 49(1.9,-0.633) 49(1.9,0.633) 49(1.9,1.9)
  rect 4.3x4.3 smd far side: 49(0,0)
  rect 4.3x4.3 smd: 49(0,0)
  round 1.034 on Top Paste: Un1(0,-1.267) Un2(1.267,-1.267) Un3(0,1.267) Un4(-1.267,0) Un5(1.267,1.267) Un6(-1.267,-1.267) Un7(0,0) Un8(1.267,0) Un9(-1.267,1.267)
F.SilkS:
  lines w0.12: -3.11,-2.56 -3.11,-3.11 -2.56,-3.11 ; -3.11,3.11 -2.56,3.11 ; 2.56,-3.11 3.11,-3.11 3.11,-2.56 ; 2.56,3.11 3.11,3.11 3.11,2.56
F.Paste:
  region: 0.456,-0.911 0.456,-1.622 0.356,-1.723 -0.356,-1.723 -0.456,-1.622 -0.456,-0.911 -0.356,-0.81 0.356,-0.81
  region: 1.723,-0.911 1.723,-1.622 1.622,-1.723 0.911,-1.723 0.81,-1.622 0.81,-0.911 0.911,-0.81 1.622,-0.81
  region: 0.456,1.622 0.456,0.911 0.356,0.81 -0.356,0.81 -0.456,0.911 -0.456,1.622 -0.356,1.723 0.356,1.723
  region: -0.81,0.356 -0.81,-0.356 -0.911,-0.456 -1.622,-0.456 -1.723,-0.356 -1.723,0.356 -1.622,0.456 -0.911,0.456
  region: 1.723,1.622 1.723,0.911 1.622,0.81 0.911,0.81 0.81,0.911 0.81,1.622 0.911,1.723 1.622,1.723
  region: -0.81,-0.911 -0.81,-1.622 -0.911,-1.723 -1.622,-1.723 -1.723,-1.622 -1.723,-0.911 -1.622,-0.81 -0.911,-0.81
  region: 0.456,0.356 0.456,-0.356 0.356,-0.456 -0.356,-0.456 -0.456,-0.356 -0.456,0.356 -0.356,0.456 0.356,0.456
  region: 1.723,0.356 1.723,-0.356 1.622,-0.456 0.911,-0.456 0.81,-0.356 0.81,0.356 0.911,0.456 1.622,0.456
  region: -0.81,1.622 -0.81,0.911 -0.911,0.81 -1.622,0.81 -1.723,0.911 -1.723,1.622 -1.622,1.723 -0.911,1.723
F.CrtYd:
  lines w0.05: -3.6,-3.6 -3.6,3.6 3.6,3.6 3.6,-3.6 -3.6,-3.6
F.Fab:
  lines w0.1: -3,-3 3,-3 3,3 -2,3 -3,2 -3,-3
  text "'.Designator'" at -4.047,-0.84 h1